# Altium footprint library komponenty_ITS_v1.PcbLib: 81 footprints (part 5 of 6)
Each footprint in its own frame and in the unit in brackets; x right, y up, seen from the top. Pads: shape width x height; smd on the part's side, far side on the other; paste and mask are expansions set on the pad; w line width, h text height; cw(c..) or ccw(c..) is an arc to the next point about the centre after c.
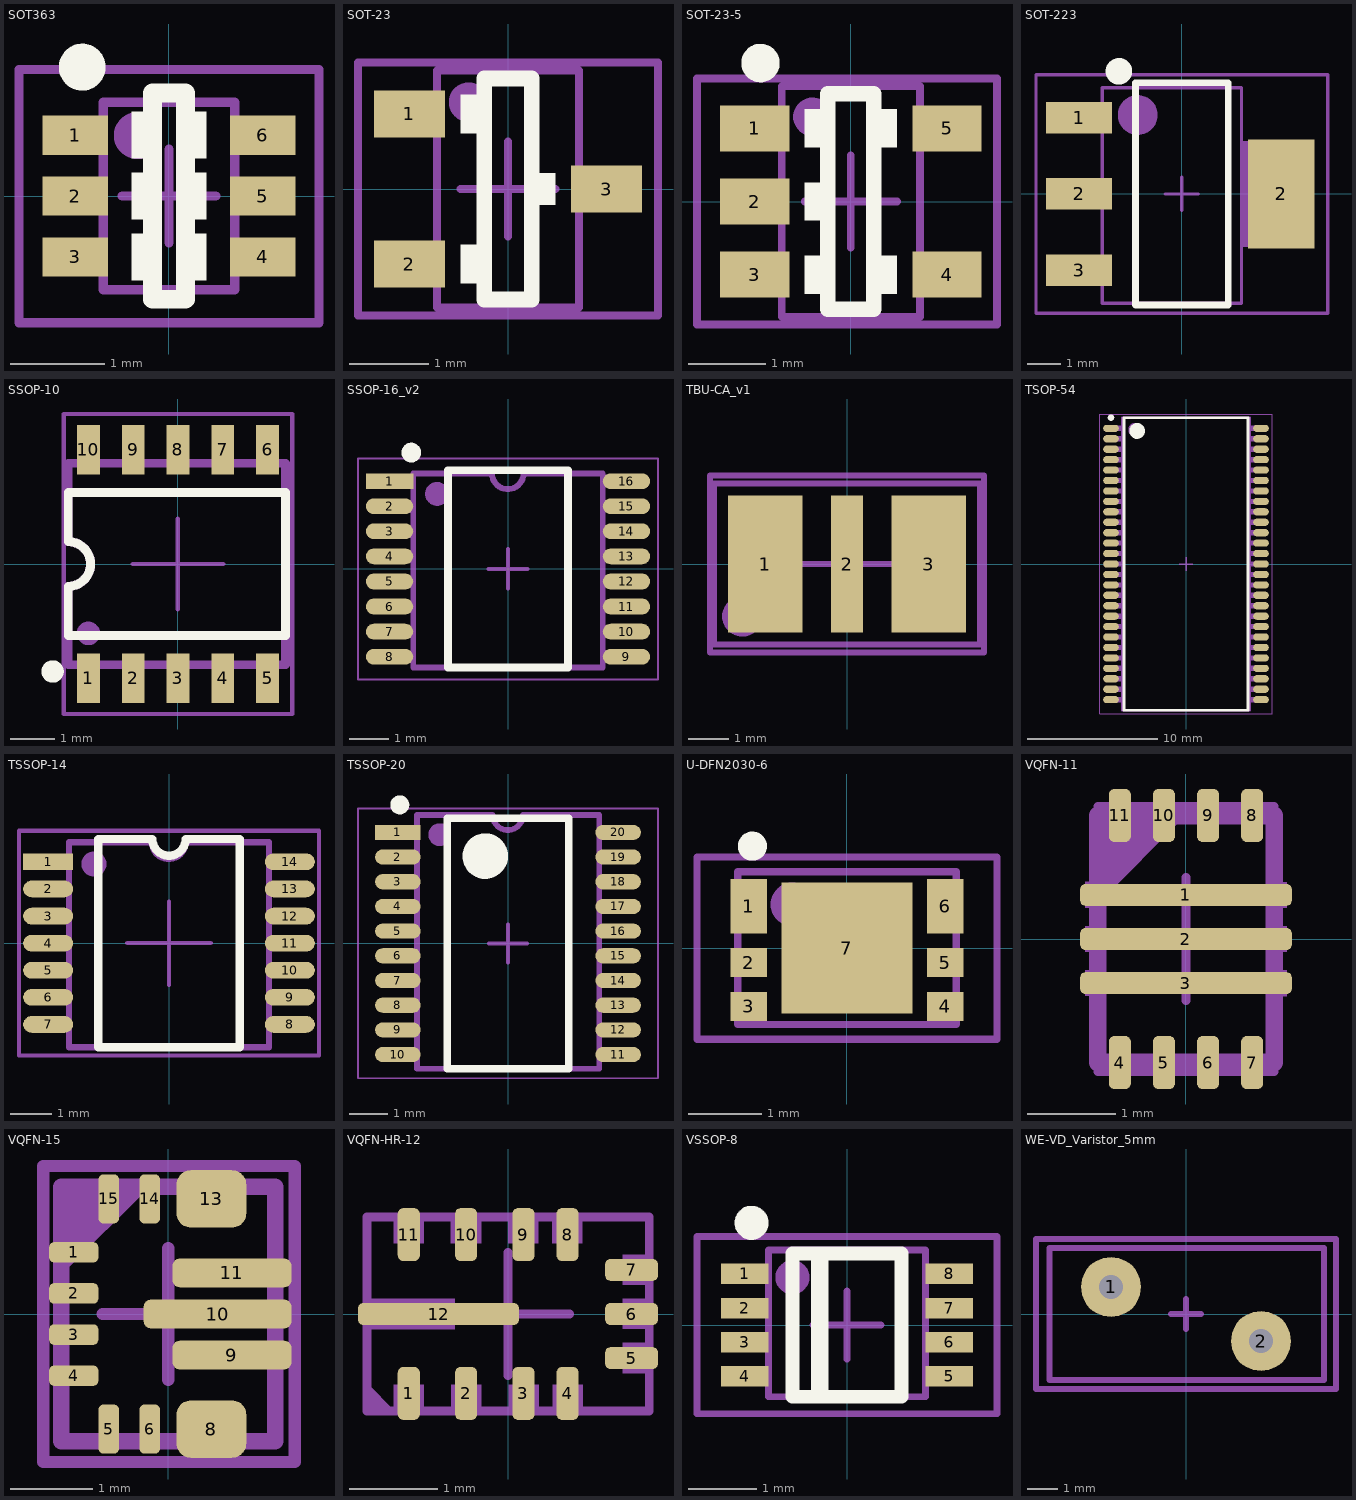
[diagram p4: the footprints below, top view; thin cyan lines are the x and y axes]

## SOT363 [mm]
height 1.1
pads (6):
  rect 0.7x0.42 smd: 1(-1,0.65) 2(-1,0) 3(-1,-0.65) 4(1,-0.65) 5(1,0) 6(1,0.65)
Top Overlay:
  circle w0.25: c-0.925,1.375 r0.125
  region: 0.4,-0.4 0.15,-0.4 0.15,-0.9 0.4,-0.9
  region: 0.4,0.25 0.15,0.25 0.15,-0.25 0.4,-0.25
  region: 0.4,0.9 0.15,0.9 0.15,0.4 0.4,0.4
  rectangle: -0.4,-0.9 -0.15,-0.4
  rectangle: -0.4,-0.25 -0.15,0.25
  rectangle: -0.4,0.4 -0.15,0.9
  lines w0.2: -0.175,-1.1 -0.175,1.1 0.175,1.1 0.175,-1.1 -0.175,-1.1
Top M11-12_SMOT:
  circle w0.3: c-0.339,0.645 r0.1
  region: 1.138,0.15 0.7,0.15 0.7,-0.161 1.138,-0.161
  rectangle: -1.138,-0.15 -0.7,0.161
  region: 1.138,0.8 0.7,0.8 0.7,0.489 1.138,0.489
  region: 1.138,-0.5 0.7,-0.5 0.7,-0.811 1.138,-0.811
  rectangle: -1.138,0.5 -0.7,0.811
  rectangle: -1.138,-0.8 -0.7,-0.489
  lines w0.1: -0.7,-1 0.7,-1 0.7,1 -0.7,1 -0.7,-1
Top M13-14_SDES:
  text "'.Designator'" at 0.25,-3.699 h0.6
M15_orgin:
  lines w0.1: -0.5,0 0.5,0 ; 0,-0.5 0,0.5 ; -1.6,-1.35 1.6,-1.35 1.6,1.35 -1.6,1.35 -1.6,-1.35
3D body "SOT363.step": height 1, standoff 0.01, extent -1.05,-1 1.05,1

## SOT-23 [mm]
pads (3):
  rect 0.9x0.6 smd: 1(-1.25,0.95) 2(-1.25,-0.95) 3(1.25,0)
Top Overlay:
  rectangle: -0.6,-1.2 -0.2,-0.7
  rectangle: -0.6,0.7 -0.2,1.2
  region: 0.6,0.2 0.2,0.2 0.2,-0.2 0.6,-0.2
  lines w0.2: -0.3,-1.4 -0.3,1.4 0.3,1.4 0.3,-1.4 -0.3,-1.4
Top M11-12_SMOT:
  circle w0.3: c-0.5,1.1 r0.1
  rectangle: -1.5,-1.2 -0.9,-0.7
  rectangle: -1.5,0.7 -0.9,1.2
  region: 1.5,0.25 0.9,0.25 0.9,-0.25 1.5,-0.25
  lines w0.1: -0.9,-1.5 -0.9,1.5 0.9,1.5 0.9,-1.5 -0.9,-1.5
Top M13-14_SDES:
  text "'.Designator'" at 0.292,-4.315 h0.7
M15_orgin:
  lines w0.1: -0.6,0 0,0 ; 0,-0.6 0,0 ; 0,0.6 0,0 ; 0.6,0 0,0 ; -1.9,-1.6 -1.9,1.6 1.9,1.6 1.9,-1.6 -1.9,-1.6
3D body "SOT-23-3.STEP": height 1.02, standoff 0.01, extent -1.27,-1.5 1.23,1.5

## SOT-23-5 [mm]
pads (5):
  rect 0.9x0.6 smd: 1(-1.25,0.95) 2(-1.25,0) 3(-1.25,-0.95) 4(1.25,-0.95) 5(1.25,0.95)
Top Overlay:
  circle w0.25: c-1.175,1.8 r0.125
  region: 0.6,1.2 0.2,1.2 0.2,0.7 0.6,0.7
  region: 0.6,-0.7 0.2,-0.7 0.2,-1.2 0.6,-1.2
  rectangle: -0.6,-1.2 -0.2,-0.7
  rectangle: -0.6,-0.25 -0.2,0.25
  rectangle: -0.6,0.7 -0.2,1.2
  lines w0.2: -0.3,-1.4 -0.3,1.4 0.3,1.4 0.3,-1.4 -0.3,-1.4
Top M11-12_SMOT:
  circle w0.3: c-0.5,1.1 r0.1
  rectangle: -1.5,-1.2 -0.9,-0.7
  rectangle: -1.5,0.7 -0.9,1.2
  region: 1.5,-0.7 0.9,-0.7 0.9,-1.2 1.5,-1.2
  region: 1.5,1.2 0.9,1.2 0.9,0.7 1.5,0.7
  rectangle: -1.5,-0.25 -0.9,0.25
  lines w0.1: -0.9,-1.5 -0.9,1.5 0.9,1.5 0.9,-1.5 -0.9,-1.5
Top M13-14_SDES:
  text "'.Designator'" at 0.292,-4.265 h0.7
M15_orgin:
  lines w0.1: -0.6,0 0,0 ; 0,-0.6 0,0 ; 0,0.6 0,0 ; 0.6,0 0,0 ; -2,-1.6 -2,1.6 1.9,1.6 1.9,-1.6 -2,-1.6
3D body "SOT23-5-1.STEP": height 1.3, standoff 0, extent -1.476,-1.525 1.524,1.475

## SOT-223 [mm]
height 1.8
pads (4):
  rect 2x0.95 smd: 1(-3.1,2.3) 2(-3.1,0) 3(-3.1,-2.3)
  rect 2x3.3 smd: 2(3,0)
Top Layer:
  rectangle: 2.2,-1.5 3.5,1.5
Top Overlay:
  circle w0.4: c-1.9,3.7 r0.2
  lines w0.2: -1.4,-3.35 1.4,-3.35 1.4,3.35 -1.4,3.35 -1.4,-3.35
Top M11-12_SMOT:
  circle w0.6: c-1.332,2.382 r0.3
  rectangle: -3.6,-2.689 -2.414,-1.9
  rectangle: -3.6,1.911 -2.414,2.7
  rectangle: -3.6,-0.389 -2.414,0.4
  rectangle: 1.8,-1.6 3.8,1.6
  lines w0.1: -2.4,-3.3 -2.4,3.2 1.8,3.2 1.8,-3.3 -2.4,-3.3
Top M13-14_SDES:
  text "'.Designator'" at 0.467,-6.165 h1
M15_orgin:
  lines w0.1: -0.5,0 0.5,0 ; 0,-0.5 0,0.5 ; -4.4,-3.6 4.4,-3.6 4.4,3.6 -4.4,3.6 -4.4,-3.6
3D body "SOT-223-2.step": height 1.7, standoff 0.02, extent -3.582,-3.276 3.378,3.223

## SSOP-10 [mm] "st viper 11 series"
pads (10):
  rect 0.51x1.1 smd: 1(-2,-2.55) 2(-1,-2.55) 3(0,-2.55) 4(1,-2.55) 5(2,-2.55) 6(2,2.55) 7(1,2.55) 8(0,2.55) 9(-1,2.55) 10(-2,2.55)
Top Overlay:
  circle w0.25: c-2.8,-2.4 r0.125
  lines w0.2: -2.45,-1.6 -2.45,-0.5 ccw(c-2.45,0) -2.45,0.5 -2.45,1.6 2.4,1.6 2.4,-1.6 -2.45,-1.6
Top M11-12_SMOT:
  circle w0.3: c-2,-1.55 r0.112
  region: -2.2,-2.25 -2.2,-3 -1.8,-3 -1.8,-2.25
  region: -1.2,-2.25 -1.2,-3 -0.8,-3 -0.8,-2.25
  region: -0.2,-2.25 -0.2,-3 0.2,-3 0.2,-2.25
  region: 0.8,-2.25 0.8,-3 1.2,-3 1.2,-2.25
  region: 1.8,-2.25 1.8,-3 2.2,-3 2.2,-2.25
  region: 2.2,2.25 2.2,3 1.8,3 1.8,2.25
  region: 1.2,2.25 1.2,3 0.8,3 0.8,2.25
  region: 0.2,2.25 0.2,3 -0.2,3 -0.2,2.25
  region: -0.8,2.25 -0.8,3 -1.2,3 -1.2,2.25
  region: -1.8,2.25 -1.8,3 -2.2,3 -2.2,2.25
  lines w0.2: -2.45,-2.25 -2.45,-0.5 ccw(c-2.45,0) -2.45,0.5 -2.45,2.25 2.4,2.25 2.4,-2.25 -2.45,-2.25
Top M13-14_SDES:
  text "'.Designator'" at -3.965,-0.292 h0.7
M15_orgin:
  lines w0.1: -1.01,0 0,0 ; 0,-1.01 0,0 ; 0,1.01 0,0 ; 1.01,0 0,0 ; -2.55,-3.35 2.55,-3.35 2.55,3.35 -2.55,3.35 -2.55,-3.35
3D body "ssop10_viper11.step": height 1.57, standoff 0.01, extent -2.45,-3 2.45,3

## SSOP-16_v2 [mm] "smoller"
height 1.8
pads (16):
  rect 1.2x0.4 smd: 1(-3,2.222)
  oval 1.2x0.4 smd: 2(-3,1.587) 3(-3,0.953) 4(-3,0.318) 5(-3,-0.318) 6(-3,-0.953) 7(-3,-1.587) 8(-3,-2.222) 9(3,-2.222) 10(3,-1.587) 11(3,-0.953) 12(3,-0.318) 13(3,0.318) 14(3,0.953) 15(3,1.587) 16(3,2.222)
Top Overlay:
  circle w0.25: c-2.45,2.947 r0.125
  lines w0.2: -1.524,-2.5 1.524,-2.5 1.524,2.5 -1.524,2.5 -1.524,-2.5
Top M11-12_SMOT:
  circle w0.3: c-1.8,1.9 r0.15
  rectangle: -3.171,-2.387 -2.371,-2.087
  rectangle: -3.171,-1.752 -2.371,-1.452
  rectangle: -3.171,-1.117 -2.371,-0.817
  rectangle: -3.171,-0.482 -2.371,-0.182
  rectangle: -3.171,0.153 -2.371,0.453
  rectangle: -3.171,0.788 -2.371,1.088
  rectangle: -3.171,1.423 -2.371,1.723
  rectangle: -3.171,2.058 -2.371,2.358
  region: 3.171,-2.058 2.371,-2.058 2.371,-2.358 3.171,-2.358
  region: 3.171,-0.153 2.371,-0.153 2.371,-0.453 3.171,-0.453
  region: 3.171,-0.788 2.371,-0.788 2.371,-1.088 3.171,-1.088
  region: 3.171,-1.423 2.371,-1.423 2.371,-1.723 3.171,-1.723
  region: 3.171,1.752 2.371,1.752 2.371,1.452 3.171,1.452
  region: 3.171,1.117 2.371,1.117 2.371,0.817 3.171,0.817
  region: 3.171,0.482 2.371,0.482 2.371,0.182 3.171,0.182
  region: 3.171,2.387 2.371,2.387 2.371,2.087 3.171,2.087
  lines w0.15: -2.4,-2.5 -2.4,2.42 -0.407,2.42 ccw(c-0.007,2.42) 0.393,2.42 2.4,2.42 2.4,-2.5 -2.4,-2.5
Top M13-14_SDES:
  text "'.Designator'" at 0.367,-5.715 h1
M15_orgin:
  lines w0.05: -3.8,-2.8 3.8,-2.8 3.8,2.8 -3.8,2.8 -3.8,-2.8
  lines w0.1: -0.5,0 0.5,0 ; 0,-0.5 0,0.5
3D body "SSOP-16.step": height 2, standoff 0, extent -3.2,-2.5 3.2,2.5

## TBU-CA_v1 [mm] "TBU single Bourns"
pads (3):
  rect 1.85x3.4 smd: 1(-2.025,0) 3(2.025,0)
  rect 0.8x3.4 smd: 2(0,0)
Top M11-12_SMOT:
  circle w0.6: c-2.6,-1.3 r0.2
  lines w0.15: -3.3,-2 3.3,-2 3.3,2 -3.3,2 -3.3,-2
Top M13-14_SDES:
  text "'.Designator'" at -5.665,-0.417 h1
M15_orgin:
  lines w0.15: -1.4,0 0,0 ; 0,-1.4 0,0 ; 0,1.4 0,0 ; 1.4,0 0,0 ; -3.4,-2.2 -3.4,2.2 3.4,2.2 3.4,-2.2 -3.4,-2.2
3D body: height 1.1, standoff 1, extent -2.998,-1.8 -2.6,-1.4
3D body: height 1, standoff 0, extent -3.3,-2 3.3,2

## TSOP-54 [mm] "TSOP, 54-Leads, Body 22,22x10,16mm, Pitch 0,80mm, IPC Medium Density"
height 1.2
pads (54):
  oval 1.2x0.55 smd: 1(-5.75,10.4) 2(-5.75,9.6) 3(-5.75,8.8) 4(-5.75,8) 5(-5.75,7.2) 6(-5.75,6.4) 7(-5.75,5.6) 8(-5.75,4.8) 9(-5.75,4) 10(-5.75,3.2) 11(-5.75,2.4) 12(-5.75,1.6) 13(-5.75,0.8) 14(-5.75,0) 15(-5.75,-0.8) 16(-5.75,-1.6) 17(-5.75,-2.4) 18(-5.75,-3.2) 19(-5.75,-4) 20(-5.75,-4.8) 21(-5.75,-5.6) 22(-5.75,-6.4) 23(-5.75,-7.2) 24(-5.75,-8) 25(-5.75,-8.8) 26(-5.75,-9.6) 27(-5.75,-10.4) 28(5.75,-10.4) 29(5.75,-9.6) 30(5.75,-8.8) 31(5.75,-8) 32(5.75,-7.2) 33(5.75,-6.4) 34(5.75,-5.6) 35(5.75,-4.8) 36(5.75,-4) 37(5.75,-3.2) 38(5.75,-2.4) 39(5.75,-1.6) 40(5.75,-0.8) 41(5.75,0) 42(5.75,0.8) 43(5.75,1.6) 44(5.75,2.4) 45(5.75,3.2) 46(5.75,4) 47(5.75,4.8) 48(5.75,5.6) 49(5.75,6.4) 50(5.75,7.2) 51(5.75,8) 52(5.75,8.8) 53(5.75,9.6) 54(5.75,10.4)
Top Overlay:
  circle w0.25: c-5.75,11.225 r0.125
  circle w0.6: c-3.75,10.2 r0.3
  lines w0.2: -4.75,-11.2 -4.75,11.2 4.75,11.2 4.75,-11.2 -4.75,-11.2
Top M11-12_SMOT:
  circle w0.6: c-3.9,10.3 r0.224
  rectangle: -5.9,-10.6 -4.9,-10.2
  rectangle: -5.9,-9 -4.9,-8.6
  rectangle: -5.9,-9.8 -4.9,-9.4
  rectangle: -5.9,-6.6 -4.9,-6.2
  rectangle: -5.9,-7.4 -4.9,-7
  rectangle: -5.9,-5 -4.9,-4.6
  rectangle: -5.9,-5.8 -4.9,-5.4
  rectangle: -5.9,-2.6 -4.9,-2.2
  rectangle: -5.9,-3.4 -4.9,-3
  rectangle: -5.9,-1 -4.9,-0.6
  rectangle: -5.9,-1.8 -4.9,-1.4
  rectangle: -5.9,1.4 -4.9,1.8
  rectangle: -5.9,0.6 -4.9,1
  rectangle: -5.9,3 -4.9,3.4
  rectangle: -5.9,2.2 -4.9,2.6
  rectangle: -5.9,5.4 -4.9,5.8
  rectangle: -5.9,4.6 -4.9,5
  rectangle: -5.9,7 -4.9,7.4
  rectangle: -5.9,6.2 -4.9,6.6
  rectangle: -5.9,9.4 -4.9,9.8
  rectangle: -5.9,8.6 -4.9,9
  rectangle: -5.9,10.2 -4.9,10.6
  region: 5.9,-10.2 4.9,-10.2 4.9,-10.6 5.9,-10.6
  region: 5.9,-9.4 4.9,-9.4 4.9,-9.8 5.9,-9.8
  region: 5.9,-8.6 4.9,-8.6 4.9,-9 5.9,-9
  region: 5.9,-7 4.9,-7 4.9,-7.4 5.9,-7.4
  region: 5.9,-6.2 4.9,-6.2 4.9,-6.6 5.9,-6.6
  region: 5.9,-5.4 4.9,-5.4 4.9,-5.8 5.9,-5.8
  region: 5.9,-4.6 4.9,-4.6 4.9,-5 5.9,-5
  region: 5.9,-3 4.9,-3 4.9,-3.4 5.9,-3.4
  region: 5.9,-2.2 4.9,-2.2 4.9,-2.6 5.9,-2.6
  region: 5.9,-1.4 4.9,-1.4 4.9,-1.8 5.9,-1.8
  region: 5.9,-0.6 4.9,-0.6 4.9,-1 5.9,-1
  region: 5.9,1 4.9,1 4.9,0.6 5.9,0.6
  region: 5.9,1.8 4.9,1.8 4.9,1.4 5.9,1.4
  region: 5.9,2.6 4.9,2.6 4.9,2.2 5.9,2.2
  region: 5.9,3.4 4.9,3.4 4.9,3 5.9,3
  region: 5.9,5 4.9,5 4.9,4.6 5.9,4.6
  region: 5.9,5.8 4.9,5.8 4.9,5.4 5.9,5.4
  region: 5.9,6.6 4.9,6.6 4.9,6.2 5.9,6.2
  region: 5.9,7.4 4.9,7.4 4.9,7 5.9,7
  region: 5.9,9 4.9,9 4.9,8.6 5.9,8.6
  region: 5.9,9.8 4.9,9.8 4.9,9.4 5.9,9.4
  region: 5.9,10.6 4.9,10.6 4.9,10.2 5.9,10.2
  rectangle: -5.9,-4.2 -4.9,-3.8
  rectangle: -5.9,-8.2 -4.9,-7.8
  rectangle: -5.9,3.8 -4.9,4.2
  rectangle: -5.9,-0.2 -4.9,0.2
  rectangle: -5.9,7.8 -4.9,8.2
  region: 5.9,-7.8 4.9,-7.8 4.9,-8.2 5.9,-8.2
  region: 5.9,-3.8 4.9,-3.8 4.9,-4.2 5.9,-4.2
  region: 5.9,0.2 4.9,0.2 4.9,-0.2 5.9,-0.2
  region: 5.9,4.2 4.9,4.2 4.9,3.8 5.9,3.8
  region: 5.9,8.2 4.9,8.2 4.9,7.8 5.9,7.8
  lines w0.2: -4.9,-11.2 -4.9,11.2 4.9,11.2 4.9,-11.2 -4.9,-11.2
Top M13-14_SDES:
  text "'.Designator'" at 0.583,-7.931 h1.4
M15_orgin:
  lines w0.05: -6.6,-11.5 -6.6,11.5 6.6,11.5 6.6,-11.5 -6.6,-11.5
  lines w0.1: -0.5,0 0.5,0 ; 0,-0.5 0,0.5
3D body "TSOP-54.step": height 1.2, standoff 0, extent -5.88,-11.2 5.88,11.2

## TSSOP-14 [mm]
pads (14):
  rect 1.2x0.4 smd mask+0.05: 1(-2.9,1.951)
  oval 1.2x0.4 smd mask+0.05: 2(-2.9,1.3) 3(-2.9,0.65) 4(-2.9,0) 5(-2.9,-0.65) 6(-2.9,-1.3) 7(-2.9,-1.951) 8(2.9,-1.951) 9(2.9,-1.3) 10(2.9,-0.65) 11(2.9,0) 12(2.9,0.65) 13(2.9,1.3) 14(2.9,1.951)
Top Overlay:
  lines w0.2: -1.7,-2.5 1.7,-2.5 1.7,2.5 0.4,2.5 cw(c0,2.5) -0.4,2.5 -1.7,2.5 -1.7,-2.5
Top M11-12_SMOT:
  circle w0.3: c-1.8,1.9 r0.15
  rectangle: -3.2,-0.801 -2.4,-0.501
  rectangle: -3.2,-1.451 -2.4,-1.151
  rectangle: -3.2,1.15 -2.4,1.45
  rectangle: -3.2,0.5 -2.4,0.8
  region: 3.2,-1.15 2.4,-1.15 2.4,-1.45 3.2,-1.45
  region: 3.2,-0.5 2.4,-0.5 2.4,-0.8 3.2,-0.8
  region: 3.2,0.801 2.4,0.801 2.4,0.501 3.2,0.501
  region: 3.2,1.451 2.4,1.451 2.4,1.151 3.2,1.151
  rectangle: -3.2,-2.101 -2.4,-1.801
  rectangle: -3.2,1.8 -2.4,2.1
  rectangle: -3.2,-0.151 -2.4,0.149
  region: 3.2,-1.8 2.4,-1.8 2.4,-2.1 3.2,-2.1
  region: 3.2,0.151 2.4,0.151 2.4,-0.149 3.2,-0.149
  region: 3.2,2.101 2.4,2.101 2.4,1.801 3.2,1.801
  lines w0.15: -2.4,-2.5 -2.4,2.42 -0.407,2.42 ccw(c-0.007,2.42) 0.393,2.42 2.4,2.42 2.4,-2.5 -2.4,-2.5
Top M13-14_SDES:
  text "'.Designator'" at -5.665,-0.417 h1
M15_orgin:
  lines w0.1: -1,0 0,0 ; 0,-1 0,0 ; 0,1 0,0 ; 1,0 0,0 ; -3.6,-2.7 3.6,-2.7 3.6,2.7 -3.6,2.7 -3.6,-2.7
3D body "TSSOP14.step": height 1.1, standoff 0, extent -3.2,-2.5 3.2,2.5

## TSSOP-20 [mm]
height 1.2
pads (20):
  rect 1.2x0.4 smd: 1(-2.9,2.925)
  oval 1.2x0.4 smd: 2(-2.9,2.275) 3(-2.9,1.625) 4(-2.9,0.975) 5(-2.9,0.325) 6(-2.9,-0.325) 7(-2.9,-0.975) 8(-2.9,-1.625) 9(-2.9,-2.275) 10(-2.9,-2.925) 11(2.9,-2.925) 12(2.9,-2.275) 13(2.9,-1.625) 14(2.9,-0.975) 15(2.9,-0.325) 16(2.9,0.325) 17(2.9,0.975) 18(2.9,1.625) 19(2.9,2.275) 20(2.9,2.925)
Top Overlay:
  circle w0.6: c-0.6,2.3 r0.3
  circle w0.25: c-2.85,3.65 r0.125
  lines w0.2: -1.6,-3.3 1.6,-3.3 1.6,3.3 -1.6,3.3 -1.6,-3.3
Top M11-12_SMOT:
  circle w0.3: c-1.799,2.866 r0.15
  rectangle: -3.199,-2.435 -2.399,-2.135
  rectangle: -3.199,-3.086 -2.399,-2.786
  rectangle: -3.199,-0.485 -2.399,-0.185
  rectangle: -3.199,-1.136 -2.399,-0.836
  rectangle: -3.199,-1.785 -2.399,-1.485
  rectangle: -3.199,1.465 -2.399,1.765
  rectangle: -3.199,0.815 -2.399,1.115
  rectangle: -3.199,0.165 -2.399,0.465
  rectangle: -3.199,2.766 -2.399,3.066
  rectangle: -3.199,2.116 -2.399,2.416
  region: 3.201,-2.784 2.401,-2.784 2.401,-3.084 3.201,-3.084
  region: 3.201,-2.134 2.401,-2.134 2.401,-2.434 3.201,-2.434
  region: 3.201,-0.834 2.401,-0.834 2.401,-1.134 3.201,-1.134
  region: 3.201,-0.184 2.401,-0.184 2.401,-0.484 3.201,-0.484
  region: 3.201,-1.484 2.401,-1.484 2.401,-1.784 3.201,-1.784
  region: 3.201,0.466 2.401,0.466 2.401,0.166 3.201,0.166
  region: 3.201,1.116 2.401,1.116 2.401,0.816 3.201,0.816
  region: 3.201,1.767 2.401,1.767 2.401,1.467 3.201,1.467
  region: 3.201,2.417 2.401,2.417 2.401,2.117 3.201,2.117
  region: 3.201,3.067 2.401,3.067 2.401,2.767 3.201,2.767
  lines w0.15: -2.399,-3.3 -2.399,3.386 -0.406,3.386 ccw(c-0.006,3.386) 0.394,3.386 2.401,3.386 2.401,-3.3 -2.399,-3.3
Top M13-14_SDES:
  text "'.Designator'" at 0.367,-5.665 h1
M15_orgin:
  lines w0.05: -3.95,-3.55 3.95,-3.55 3.95,3.55 -3.95,3.55 -3.95,-3.55
  lines w0.1: -0.5,0 0.5,0 ; 0,-0.5 0,0.5
3D body "TSSOP-20.step": height 1.21, standoff 0.01, extent -3.275,-3.3 3.275,3.3

## U-DFN2030-6 [mm] "DIODEC modyfied DFN-6"
height 0.6
pads (7):
  rect 0.5x0.75 smd: 1(-1.35,0.575) 6(1.35,0.575)
  rect 0.5x0.4 smd: 2(-1.35,-0.2) 3(-1.35,-0.8) 4(1.35,-0.8) 5(1.35,-0.2)
  rect 1.8x1.8 smd: 7(0,0)
Top Overlay:
  circle w0.2: c-1.3,1.4 r0.1
Top M11-12_SMOT:
  circle w0.3: c-0.75,0.6 r0.15
  rectangle: -1.5,0.25 -1.2,0.9
  rectangle: -1.5,-0.35 -1.2,-0.05
  rectangle: -1.5,-0.95 -1.2,-0.65
  rectangle: 1.2,-0.95 1.5,-0.65
  rectangle: 1.2,-0.35 1.5,-0.05
  rectangle: 1.2,0.25 1.5,0.9
  lines w0.1: -1.5,-1.05 1.5,-1.05 1.5,1.05 -1.5,1.05 -1.5,-1.05
Top M13-14_SDES:
  text "'.Designator'" at 0.2,-3.399 h0.6
M15_orgin:
  lines w0.1: -0.5,0 0.5,0 ; 0,-0.5 0,0.5 ; -2.06,-1.25 -2.06,1.25 2.06,1.25 2.06,-1.25 -2.06,-1.25
3D body "U-DFN2030-6.step": height 0.6, standoff 0, extent -1.51,-1.075 1.51,1.075

## VQFN-11 [mm] "3-V to 17-V 4-A Step-Down Converters"
pads (11):
  rrect50% 2.4x0.25 smd paste-0.25 mask+0.05: 1(0,0.5) 2(0,0) 3(0,-0.5)
  rrect50% 0.25x0.6 smd paste+0 mask+0.05: 4(-0.75,-1.4) 5(-0.25,-1.4) 6(0.25,-1.4) 7(0.75,-1.4) 8(0.75,1.4) 9(0.25,1.4) 10(-0.25,1.4) 11(-0.75,1.4)
Top Paste:
  drawing of 9 lines, arcs and shapes, not listed
Top M11-12_SMOT:
  region: -1.052,-0.648 -1.052,-0.35 -1.145,-0.35 -1.145,-0.648
  region: -0.602,-1.452 -0.9,-1.452 -0.9,-1.545 -0.602,-1.545
  region: -0.102,-1.452 -0.4,-1.452 -0.4,-1.545 -0.102,-1.545
  region: -1.052,0.352 -1.052,0.65 -1.145,0.65 -1.145,0.352
  rectangle: -0.898,1.452 -0.6,1.545
  rectangle: -0.398,1.452 -0.1,1.545
  region: 1.052,-0.352 1.052,-0.65 1.145,-0.65 1.145,-0.352
  region: 0.398,-1.452 0.1,-1.452 0.1,-1.545 0.398,-1.545
  region: 0.898,-1.452 0.6,-1.452 0.6,-1.545 0.898,-1.545
  region: 1.052,0.648 1.052,0.35 1.145,0.35 1.145,0.648
  rectangle: 0.102,1.452 0.4,1.545
  rectangle: 0.602,1.452 0.9,1.545
  region: -1.052,-0.148 -1.052,0.15 -1.145,0.15 -1.145,-0.148
  region: 1.052,0.148 1.052,-0.15 1.145,-0.15 1.145,0.148
  region: -1.044,1.428 0.028,1.428 -1.028,0.372 -1.028,0.369
  lines w0.2: -1,-1.4 -1,1.4 1,1.4 1,-1.4 -1,-1.4
Top M13-14_SDES:
  text "'.Designator'" at -0.231,2.818 h0.5
M15_orgin:
  lines w0.1: -0.7,0 0,0 ; 0,-0.7 0,0 ; 0,0.7 0,0 ; 0.7,0 0,0 ; -1,-1.5 1,-1.5 1,1.5 -1,1.5 -1,-1.5
3D body: height 1, standoff 0, extent -1,-1.5 1,1.5
3D body: height 1.01, standoff 1, extent -0.842,0.919 -0.443,1.318
3D body: height 0.2, standoff 0, extent -1.014,-0.6 -1,-0.4
3D body: height 0.2, standoff 0, extent -0.354,-1.51 -0.154,-1.496
3D body: height 0.2, standoff 0, extent -0.854,-1.51 -0.654,-1.496
3D body: height 0.2, standoff 0, extent -1.014,0.4 -1,0.6
3D body: height 0.2, standoff 0, extent -0.346,1.496 -0.146,1.51
3D body: height 0.2, standoff 0, extent -0.846,1.496 -0.646,1.51
3D body: height 0.2, standoff 0, extent 1,-0.6 1.014,-0.4
3D body: height 0.2, standoff 0, extent 0.646,-1.51 0.846,-1.496
3D body: height 0.2, standoff 0, extent 0.146,-1.51 0.346,-1.496
3D body: height 0.2, standoff 0, extent 1,0.4 1.014,0.6
3D body: height 0.2, standoff 0, extent 0.654,1.496 0.854,1.51
3D body: height 0.2, standoff 0, extent 0.154,1.496 0.354,1.51
3D body: height 0.2, standoff 0, extent -1.014,-0.1 -1,0.1
3D body: height 0.2, standoff 0, extent 1,-0.1 1.014,0.1

## VQFN-15 [mm] "TI VQFN power package"
pads (13):
  rrect50% 0.6x0.25 smd mask+0.05: 1(-1.15,0.75) 2(-1.15,0.25) 3(-1.15,-0.25) 4(-1.15,-0.75)
  rrect50% 0.25x0.6 smd mask+0.05: 5(-0.725,-1.4) 6(-0.225,-1.4) 14(-0.225,1.4) 15(-0.725,1.4)
  rrect50% 0.85x0.7 smd paste-0.45 mask-0.5: 8(0.525,-1.4) 13(0.525,1.4)
  rrect50% 1.45x0.35 smd paste-0.175 mask-0.05: 9(0.775,-0.5) 11(0.775,0.5)
  rrect50% 1.8x0.35 smd paste-0.175 mask-0.05: 10(0.6,0)
Top Paste:
  drawing of 8 lines, arcs and shapes, not listed
Top Solder:
  region: 0.15,1.25 0.15,1.6 0.15,1.62 0.165,1.657 0.193,1.685 0.23,1.7 0.25,1.7 0.3,1.7 0.32,1.7 0.357,1.685 0.385,1.657 0.4,1.62 0.4,1.6 0.4,1.35 0.65,1.35 0.65,1.6 0.65,1.62 0.665,1.657 0.693,1.685 0.73,1.7 0.75,1.7 0.8,1.7 0.82,1.7 0.857,1.685 0.885,1.657 0.9,1.62 0.9,1.6 0.9,1.25 0.9,1.22 0.877,1.165 0.835,1.123 0.78,1.1 0.75,1.1 0.3,1.1 0.27,1.1 0.215,1.123 0.173,1.165 0.15,1.22
  region: 0.9,-1.235 0.9,-1.6 0.9,-1.62 0.885,-1.657 0.857,-1.685 0.82,-1.7 0.8,-1.7 0.75,-1.7 0.73,-1.7 0.693,-1.685 0.665,-1.657 0.65,-1.62 0.65,-1.6 0.65,-1.35 0.4,-1.35 0.4,-1.6 0.4,-1.62 0.385,-1.657 0.357,-1.685 0.32,-1.7 0.3,-1.7 0.25,-1.7 0.23,-1.7 0.193,-1.685 0.165,-1.657 0.15,-1.62 0.15,-1.6 0.15,-1.25 0.15,-1.22 0.173,-1.165 0.215,-1.123 0.27,-1.1 0.3,-1.1 0.765,-1.1 0.792,-1.1 0.841,-1.121 0.879,-1.159 0.9,-1.208
Top M11-12_SMOT:
  region: -1.3,1.55 -0.228,1.55 -1.284,0.494 -1.284,0.491
  lines w0.05: 1.3,-1.55 ccw(c1.3,-1.55) 1.3,-1.55 ; 1.3,-1.55 ccw(c1.3,-1.55) 1.3,-1.55
  lines w0.2: -1.3,-1.55 1.3,-1.55 1.3,1.55 -1.3,1.55 -1.3,-1.55 ; -1.3,-1.55 -1.3,-1.55
Top M13-14_SDES:
  text "'.Designator'" at -5.665,-0.417 h1
M15_orgin:
  lines w0.15: -0.8,0 0,0 ; 0,-0.8 0,0 ; 0,0.8 0,0 ; 0.8,0 0,0 ; -1.523,-1.8 -1.523,1.8 1.541,1.8 1.541,-1.8 -1.523,-1.8
3D body: height 1, standoff 0, extent -1.3,-1.55 1.3,1.55
3D body: height 0.2, standoff 0, extent 1.206,-0.135 1.309,0.14
3D body: height 0.2, standoff 0, extent 0.134,1.461 0.409,1.565
3D body: height 0.2, standoff 0, extent 0.634,1.461 0.91,1.564
3D body: height 0.2, standoff 0, extent 1.211,0.364 1.315,0.639
3D body: height 0.2, standoff 0, extent 0.641,-1.565 0.916,-1.461
3D body: height 0.2, standoff 0, extent 0.141,-1.564 0.416,-1.461
3D body: height 0.2, standoff 0, extent 1.211,-0.636 1.315,-0.361
3D body: height 0.2, standoff 0, extent -0.334,1.511 -0.116,1.564
3D body: height 0.2, standoff 0, extent -0.834,1.511 -0.616,1.564
3D body: height 0.2, standoff 0, extent -1.314,0.641 -1.261,0.859
3D body: height 0.2, standoff 0, extent -1.314,0.141 -1.261,0.359
3D body: height 1.05, standoff 1, extent -1.149,0.751 -0.451,1.449
3D body: height 0.2, standoff 0, extent -1.314,-0.359 -1.261,-0.141
3D body: height 0.2, standoff 0, extent -1.314,-0.859 -1.261,-0.641
3D body: height 0.2, standoff 0, extent -0.834,-1.564 -0.616,-1.511
3D body: height 0.2, standoff 0, extent -0.334,-1.564 -0.116,-1.511

## VQFN-HR-12 [mm] "TI VQFN-HR-12"
pads (12):
  rrect50% 0.25x0.6 smd paste+0 mask+0.05: 1(-1.125,-0.9) 2(-0.475,-0.9) 3(0.175,-0.9) 4(0.675,-0.9) 8(0.675,0.9) 9(0.175,0.9) 10(-0.475,0.9) 11(-1.125,0.9)
  rrect50% 0.6x0.25 smd paste+0 mask+0.05: 5(1.4,-0.5) 6(1.4,0) 7(1.4,0.5)
  rrect50% 1.825x0.25 smd paste-0.25 mask+0.05: 12(-0.788,0)
Top Paste:
  region: -0.951,-0.125 -1.638,-0.125 -1.65,-0.125 -1.673,-0.115 -1.691,-0.098 -1.7,-0.075 -1.7,-0.062 -1.7,-0.063 -1.7,0.063 -1.7,0.075 -1.691,0.098 -1.673,0.115 -1.65,0.125 -1.638,0.125 -0.951,0.125 -0.939,0.125 -0.916,0.115 -0.898,0.098 -0.888,0.075 -0.888,0.063 -0.888,-0.063 -0.888,-0.075 -0.898,-0.098 -0.916,-0.115 -0.939,-0.125
  region: 0.125,-0.063 0.125,-0.075 0.115,-0.098 0.097,-0.115 0.074,-0.125 0.062,-0.125 -0.625,-0.125 -0.637,-0.125 -0.66,-0.115 -0.678,-0.098 -0.687,-0.075 -0.687,-0.062 -0.687,0.063 -0.687,0.075 -0.678,0.098 -0.66,0.115 -0.637,0.125 -0.625,0.125 0.062,0.125 0.074,0.125 0.097,0.115 0.115,0.098 0.125,0.075 0.125,0.063
Top M11-12_SMOT:
  rectangle: 1.3,-0.172 1.646,0.175
  region: -0.6,0.173 -1.647,0.173 -1.647,-0.174 -0.6,-0.174
  rectangle: 1.3,0.328 1.646,0.675
  region: 0.847,0.8 0.847,1.146 0.5,1.146 0.5,0.8
  region: 0.347,0.8 0.347,1.146 0,1.146 0,0.8
  region: 0.003,-0.8 0.003,-1.146 0.35,-1.146 0.35,-0.8
  region: 0.503,-0.8 0.503,-1.146 0.85,-1.146 0.85,-0.8
  rectangle: 1.3,-0.672 1.646,-0.325
  region: -0.303,0.8 -0.303,1.146 -0.65,1.146 -0.65,0.8
  region: -0.953,0.8 -0.953,1.146 -1.3,1.146 -1.3,0.8
  region: -1.297,-0.8 -1.297,-1.146 -0.95,-1.146 -0.95,-0.8
  region: -0.647,-0.8 -0.647,-1.146 -0.3,-1.146 -0.3,-0.8
  region: -1.6,-1.1 -1.6,-0.781 -1.281,-1.1
  lines w0.1: -1.6,-1.1 1.6,-1.1 1.6,1.1 -1.6,1.1 -1.6,-1.1
Top M13-14_SDES:
  text "'.Designator'" at 0.65,-3.399 h0.6
M15_orgin:
  lines w0.1: -0.7,0 0,0 ; 0,-0.7 0,0 ; 0,0.7 0,0 ; 0.7,0 0,0 ; -1.6,-1.1 -1.6,1.1 1.6,1.1 1.6,-1.1 -1.6,-1.1
3D body: height 0.3, standoff 0, extent 1.45,-0.125 1.637,0.125
3D body: height 0.3, standoff 0, extent -1.637,-0.125 -1.45,0.125
3D body: height 0.3, standoff 0, extent 0.05,0.95 0.3,1.138
3D body: height 0.3, standoff 0, extent 0.55,0.95 0.8,1.138
3D body: height 0.3, standoff 0, extent 1.45,0.375 1.637,0.625
3D body: height 0.3, standoff 0, extent 1.45,-0.625 1.637,-0.375
3D body: height 0.3, standoff 0, extent 0.55,-1.138 0.8,-0.95
3D body: height 0.3, standoff 0, extent 0.05,-1.138 0.3,-0.95
3D body: height 0.3, standoff 0, extent -1.25,0.95 -1,1.138
3D body: height 0.3, standoff 0, extent -0.6,0.95 -0.35,1.138
3D body: height 0.3, standoff 0, extent -0.6,-1.138 -0.35,-0.95
3D body: height 0.3, standoff 0, extent -1.25,-1.138 -1,-0.95
3D body: height 0.95, standoff 0, extent -1.496,-1 -1.098,-0.6
3D body: height 0.9, standoff 0, extent -1.6,-1.1 1.6,1.1

## VSSOP-8 [mm]
height 0.9
pads (8):
  rect 0.7x0.3 smd: 1(-1.5,0.75) 2(-1.5,0.25) 3(-1.5,-0.25) 4(-1.5,-0.75) 5(1.5,-0.75) 6(1.5,-0.25) 7(1.5,0.25) 8(1.5,0.75)
Top Overlay:
  circle w0.25: c-1.4,1.5 r0.125
  lines w0.2: -0.8,-1.05 -0.8,1.05 0.8,1.05 0.8,-1.05 -0.8,-1.05
  lines w0.254: -0.4,-1 -0.4,1
Top M11-12_SMOT:
  circle w0.25: c-0.8,0.7 r0.125
  region: 1.55,0.85 1.15,0.85 1.15,0.65 1.55,0.65
  region: 1.55,0.35 1.15,0.35 1.15,0.15 1.55,0.15
  region: 1.55,-0.15 1.15,-0.15 1.15,-0.35 1.55,-0.35
  region: 1.55,-0.65 1.15,-0.65 1.15,-0.85 1.55,-0.85
  rectangle: -1.55,0.15 -1.15,0.35
  rectangle: -1.55,0.65 -1.15,0.85
  rectangle: -1.55,-0.85 -1.15,-0.65
  rectangle: -1.55,-0.35 -1.15,-0.15
  lines w0.1: -1.15,-1.05 1.15,-1.05 1.15,1.1 -1.15,1.1 -1.15,-1.05
Top M13-14_SDES:
  text "'.Designator'" at 0.25,-3.399 h0.6
M15_orgin:
  lines w0.1: -0.5,0 0.5,0 ; 0,-0.5 0,0.5 ; -2.2,-1.3 -2.2,1.3 2.2,1.3 2.2,-1.3 -2.2,-1.3
3D body "VSSOP-8.step": height 0.9, standoff 0, extent -1.549,-1.05 1.549,1.05

## WE-VD_Varistor_5mm [mm] "WE-VD Disk Varistor 5mm"
pads (2):
  round 2 hole 0.8 unplated: 1(-2.5,0.9) 2(2.5,-0.9)
M15_orgin:
  lines w0.2: -0.5,0 0,0 ; 0,-0.5 0,0 ; 0,0.5 0,0 ; 0.5,0 0,0 ; -5,-2.5 5,-2.5 5,2.5 -5,2.5 -5,-2.5
Top M17-18_TDES:
  text "'.Designator'" at -5.715,2.933 h1
Top M19-20_TMOT:
  lines w0.2: -4.55,-2.2 4.6,-2.2 4.6,2.2 -4.55,2.2 -4.55,-2.2
3D body "WE-VD_5_mm_short.STEP": height 10.75, standoff -1.75, extent -3.75,-1.926 3.746,1.926